# Altium schematic symbol library IC.SchLib: 555 symbols (part 11 of 15)
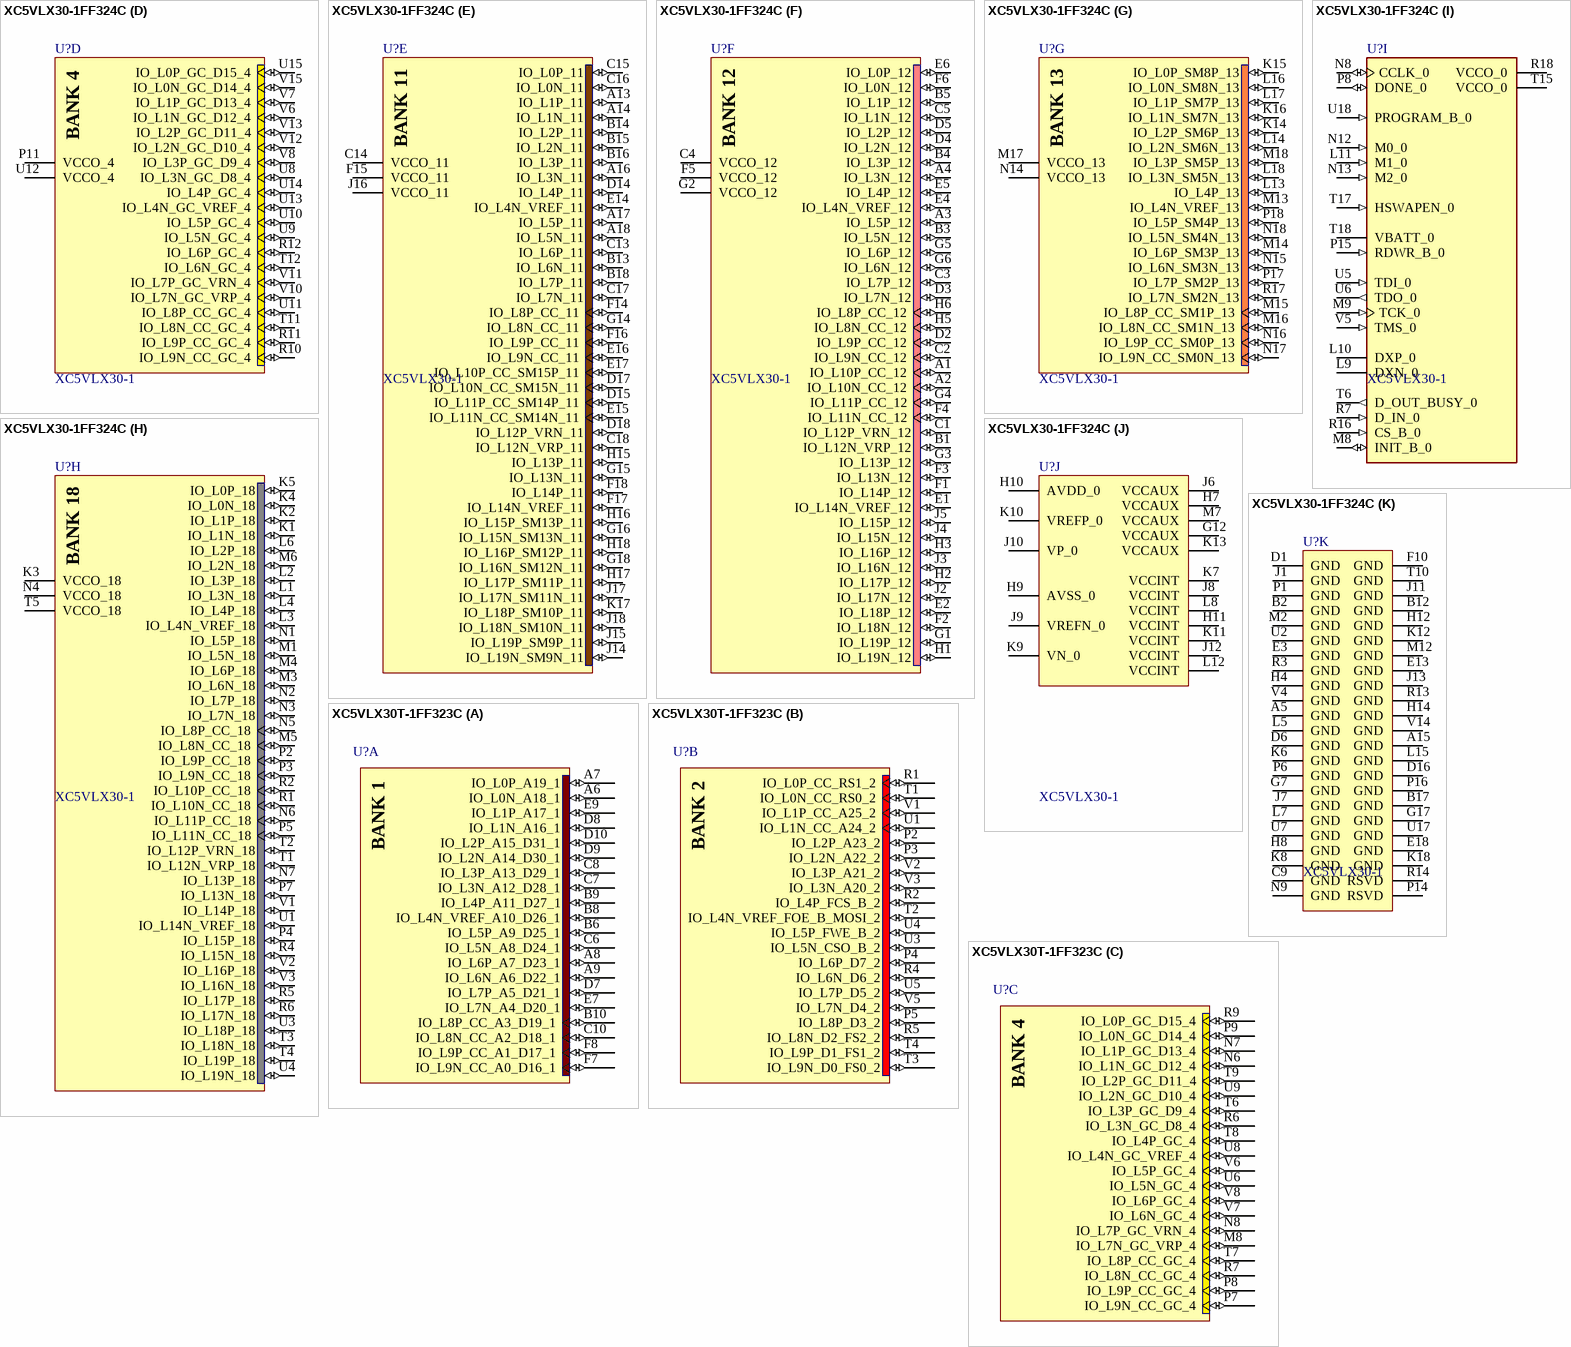
[diagram p80: symbols XC5VLX30-1FF324C to XC5VLX30T-1FF323C]

## XC5VLX30-1FF324C
designator U?, comment XC5VLX30-1
Xilinx Virtex-5 LX Platform FPGA, 324-Ball FFBGA, Speed Grade 1, 220 User I/Os, Commercial Grade; Manufacturer No: XC5VLX30-1FFG324C; Sort: 510; Tech: SMDR; Price: 0; Package: BGA324; Manufacturer: Xilinx
footprint FF324 (BGA, 324-Leads, Body 19x19mm, Pitch 1mm)
3D model XC5VLX30-FF324 (324-Ball Flip Chip Ball Grid Array (FF324))
signal-integrity model XC5VLX30_FF324 (Virtex-5)
part A pins: B7 VCCO_1 (power), C6 IO_L9N_CC_A0_D16_1 (io), C12 IO_L4P_A11_D27_1 (io), D7 IO_L9P_CC_A1_D17_1 (io), D8 IO_L7P_A5_D21_1 (io), D12 IO_L2N_A14_D30_1 (io), D13 IO_L4N_VREF_A10_D26_1 (io), E7 IO_L7N_A4_D20_1 (io), E8 VCCO_1 (power), E12 IO_L2P_A15_D31_1 (io), F7 IO_L5N_A8_D24_1 (io), F8 IO_L3P_A13_D29_1 (io), F9 IO_L1N_A16_1 (io), F11 IO_L0P_A19_1 (io), F12 IO_L6P_A7_D23_1 (io), F13 IO_L6N_A6_D22_1 (io), G8 IO_L5P_A9_D25_1 (io), G9 IO_L3N_A12_D28_1 (io), G10 IO_L1P_A17_1 (io), G11 IO_L0N_A18_1 (io), G13 IO_L8P_CC_A3_D19_1 (io), H13 IO_L8N_CC_A2_D18_1 (io)
part B pins: M10 IO_L6N_D6_2 (io), M11 IO_L8N_D2_FS2_2 (io), N10 IO_L6P_D7_2 (io), N11 IO_L8P_D3_2 (io), P9 IO_L4N_VREF_FOE_B_MOSI_2 (io), P10 IO_L4P_FCS_B_2 (io), P12 IO_L9N_D0_FS0_2 (io), P13 IO_L9P_D1_FS1_2 (io), R8 VCCO_2 (power), R9 IO_L2P_A23_2 (io), R15 IO_L1P_CC_A25_2 (io), T7 IO_L0N_CC_RS0_2 (io), T8 IO_L0P_CC_RS1_2 (io), T9 IO_L2N_A22_2 (io), T13 IO_L7N_D4_2 (io), T14 IO_L7P_D5_2 (io), T16 IO_L1N_CC_A24_2 (io), U16 IO_L5P_FWE_B_2 (io), V9 VCCO_2 (power), V16 IO_L5N_CSO_B_2 (io), V17 IO_L3N_A20_2 (io), V18 IO_L3P_A21_2 (io)
part C pins: A6 IO_L6P_GC_3 (io), A7 IO_L6N_GC_3 (io), A8 IO_L0P_CC_GC_3 (io), A9 IO_L0N_CC_GC_3 (io), A10 VCCO_3 (power), A11 IO_L9P_GC_3 (io), A12 IO_L9N_GC_3 (io), B6 IO_L8P_GC_3 (io), B8 IO_L4N_GC_VREF_3 (io), B9 IO_L1P_CC_GC_3 (io), B10 IO_L1N_CC_GC_3 (io), B11 IO_L7P_GC_3 (io), C7 IO_L8N_GC_3 (io), C8 IO_L4P_GC_3 (io), C10 IO_L5N_GC_3 (io), C11 IO_L7N_GC_3 (io), D9 IO_L2N_GC_VRP_3 (io), D10 IO_L5P_GC_3 (io), D11 VCCO_3 (power), E9 IO_L2P_GC_VRN_3 (io), E10 IO_L3P_GC_3 (io), E11 IO_L3N_GC_3 (io)
part D pins: P11 VCCO_4 (power), R10 IO_L9N_CC_GC_4 (io), R11 IO_L9P_CC_GC_4 (io), R12 IO_L6P_GC_4 (io), T11 IO_L8N_CC_GC_4 (io), T12 IO_L6N_GC_4 (io), U8 IO_L3N_GC_D8_4 (io), U9 IO_L5N_GC_4 (io), U10 IO_L5P_GC_4 (io), U11 IO_L8P_CC_GC_4 (io), U12 VCCO_4 (power), U13 IO_L4N_GC_VREF_4 (io), U14 IO_L4P_GC_4 (io), U15 IO_L0P_GC_D15_4 (io), V6 IO_L1N_GC_D12_4 (io), V7 IO_L1P_GC_D13_4 (io), V8 IO_L3P_GC_D9_4 (io), V10 IO_L7N_GC_VRP_4 (io), V11 IO_L7P_GC_VRN_4 (io), V12 IO_L2N_GC_D10_4 (io), V13 IO_L2P_GC_D11_4 (io), V15 IO_L0N_GC_D14_4 (io)
part E pins: A13 IO_L1P_11 (io), A14 IO_L1N_11 (io), A16 IO_L3N_11 (io), A17 IO_L5P_11 (io), A18 IO_L5N_11 (io), B13 IO_L6N_11 (io), B14 IO_L2P_11 (io), B15 IO_L2N_11 (io), B16 IO_L3P_11 (io), B18 IO_L7P_11 (io), C13 IO_L6P_11 (io), C14 VCCO_11 (power), C15 IO_L0P_11 (io), C16 IO_L0N_11 (io), C17 IO_L7N_11 (io), C18 IO_L12N_VRP_11 (io), D14 IO_L4P_11 (io), D15 IO_L11P_CC_SM14P_11 (io), D17 IO_L10N_CC_SM15N_11 (io), D18 IO_L12P_VRN_11 (io), E14 IO_L4N_VREF_11 (io), E15 IO_L11N_CC_SM14N_11 (io), E16 IO_L9N_CC_11 (io), E17 IO_L10P_CC_SM15P_11 (io), F14 IO_L8P_CC_11 (io), F15 VCCO_11 (power), F16 IO_L9P_CC_11 (io), F17 IO_L14N_VREF_11 (io), F18 IO_L14P_11 (io), G14 IO_L8N_CC_11 (io), G15 IO_L13N_11 (io), G16 IO_L15N_SM13N_11 (io), G18 IO_L16N_SM12N_11 (io), H15 IO_L13P_11 (io), H16 IO_L15P_SM13P_11 (io), H17 IO_L17P_SM11P_11 (io), H18 IO_L16P_SM12P_11 (io), J14 IO_L19N_SM9N_11 (io), J15 IO_L19P_SM9P_11 (io), J16 VCCO_11 (power), J17 IO_L17N_SM11N_11 (io), J18 IO_L18N_SM10N_11 (io), K17 IO_L18P_SM10P_11 (io)
part F pins: A1 IO_L10P_CC_12 (io), A2 IO_L10N_CC_12 (io), A3 IO_L5P_12 (io), A4 IO_L3N_12 (io), B1 IO_L12N_VRP_12 (io), B3 IO_L5N_12 (io), B4 IO_L3P_12 (io), B5 IO_L1P_12 (io), C1 IO_L12P_VRN_12 (io), C2 IO_L9N_CC_12 (io), C3 IO_L7P_12 (io), C4 VCCO_12 (power), C5 IO_L1N_12 (io), D2 IO_L9P_CC_12 (io), D3 IO_L7N_12 (io), D4 IO_L2N_12 (io), D5 IO_L2P_12 (io), E1 IO_L14N_VREF_12 (io), E2 IO_L18P_12 (io), E4 IO_L4N_VREF_12 (io), E5 IO_L4P_12 (io), E6 IO_L0P_12 (io), F1 IO_L14P_12 (io), F2 IO_L18N_12 (io), F3 IO_L13N_12 (io), F4 IO_L11N_CC_12 (io), F5 VCCO_12 (power), F6 IO_L0N_12 (io), G1 IO_L19P_12 (io), G2 VCCO_12 (power), G3 IO_L13P_12 (io), G4 IO_L11P_CC_12 (io), G5 IO_L6P_12 (io), G6 IO_L6N_12 (io), H1 IO_L19N_12 (io), H2 IO_L17P_12 (io), H3 IO_L16P_12 (io), H5 IO_L8N_CC_12 (io), H6 IO_L8P_CC_12 (io), J2 IO_L17N_12 (io), J3 IO_L16N_12 (io), J4 IO_L15N_12 (io), J5 IO_L15P_12 (io)
part G pins: K14 IO_L2P_SM6P_13 (io), K15 IO_L0P_SM8P_13 (io), K16 IO_L1N_SM7N_13 (io), L13 IO_L4P_13 (io), L14 IO_L2N_SM6N_13 (io), L16 IO_L0N_SM8N_13 (io), L17 IO_L1P_SM7P_13 (io), L18 IO_L3N_SM5N_13 (io), M13 IO_L4N_VREF_13 (io), M14 IO_L6P_SM3P_13 (io), M15 IO_L8P_CC_SM1P_13 (io), M16 IO_L8N_CC_SM1N_13 (io), M17 VCCO_13 (power), M18 IO_L3P_SM5P_13 (io), N14 VCCO_13 (power), N15 IO_L6N_SM3N_13 (io), N16 IO_L9P_CC_SM0P_13 (io), N17 IO_L9N_CC_SM0N_13 (io), N18 IO_L5N_SM4N_13 (io), P17 IO_L7P_SM2P_13 (io), P18 IO_L5P_SM4P_13 (io), R17 IO_L7N_SM2N_13 (io)
part H pins: K1 IO_L1N_18 (io), K2 IO_L1P_18 (io), K3 VCCO_18 (power), K4 IO_L0N_18 (io), K5 IO_L0P_18 (io), L1 IO_L3N_18 (io), L2 IO_L3P_18 (io), L3 IO_L4N_VREF_18 (io), L4 IO_L4P_18 (io), L6 IO_L2P_18 (io), M1 IO_L5N_18 (io), M3 IO_L6N_18 (io), M4 IO_L6P_18 (io), M5 IO_L8N_CC_18 (io), M6 IO_L2N_18 (io), N1 IO_L5P_18 (io), N2 IO_L7P_18 (io), N3 IO_L7N_18 (io), N4 VCCO_18 (power), N5 IO_L8P_CC_18 (io), N6 IO_L11P_CC_18 (io), N7 IO_L13P_18 (io), P2 IO_L9P_CC_18 (io), P3 IO_L9N_CC_18 (io), P4 IO_L15P_18 (io), P5 IO_L11N_CC_18 (io), P7 IO_L13N_18 (io), R1 IO_L10N_CC_18 (io), R2 IO_L10P_CC_18 (io), R4 IO_L15N_18 (io), R5 IO_L17P_18 (io), R6 IO_L17N_18 (io), T1 IO_L12N_VRP_18 (io), T2 IO_L12P_VRN_18 (io), T3 IO_L18N_18 (io), T4 IO_L19P_18 (io), T5 VCCO_18 (power), U1 IO_L14N_VREF_18 (io), U3 IO_L18P_18 (io), U4 IO_L19N_18 (io), V1 IO_L14P_18 (io), V2 IO_L16P_18 (io), V3 IO_L16N_18 (io)
part I pins: L9 DXN_0, L10 DXP_0, L11 M1_0 (in), M8 INIT_B_0 (io), M9 TCK_0 (in), N8 CCLK_0 (io), N12 M0_0 (in), N13 M2_0 (in), P8 DONE_0 (io), P15 RDWR_B_0 (in), R7 D_IN_0 (in), R16 CS_B_0 (in), R18 VCCO_0 (power), T6 D_OUT_BUSY_0 (out), T15 VCCO_0 (power), T17 HSWAPEN_0 (in), T18 VBATT_0 (power), U5 TDI_0 (in), U6 TDO_0 (out), U18 PROGRAM_B_0 (in), V5 TMS_0 (in)
part J pins: G12 VCCAUX (power), H7 VCCAUX (power), H9 AVSS_0, H10 AVDD_0, H11 VCCINT (power), J6 VCCAUX (power), J8 VCCINT (power), J9 VREFN_0, J10 VP_0, J12 VCCINT (power), K7 VCCINT (power), K9 VN_0, K10 VREFP_0, K11 VCCINT (power), K13 VCCAUX (power), L8 VCCINT (power), L12 VCCINT (power), M7 VCCAUX (power)
part K pins: A5 GND (power), A15 GND (power), B2 GND (power), B12 GND (power), B17 GND (power), C9 GND (power), D1 GND (power), D6 GND (power), D16 GND (power), E3 GND (power), E13 GND (power), E18 GND (power), F10 GND (power), G7 GND (power), G17 GND (power), H4 GND (power), H8 GND (power), H12 GND (power), H14 GND (power), J1 GND (power), J7 GND (power), J11 GND (power), J13 GND (power), K6 GND (power), K8 GND (power), K12 GND (power), K18 GND (power), L5 GND (power), L7 GND (power), L15 GND (power), M2 GND (power), M12 GND (power), N9 GND (power), P1 GND (power), P6 GND (power), P14 RSVD, P16 GND (power), R3 GND (power), R13 GND (power), R14 RSVD, T10 GND (power), U2 GND (power), U7 GND (power), U17 GND (power), V4 GND (power), V14 GND (power)
part A text: BANK 1
part B text: BANK 2
part C text: BANK 3
part D text: BANK 4
part E text: BANK 11
part F text: BANK 12
part G text: BANK 13
part H text: BANK 18

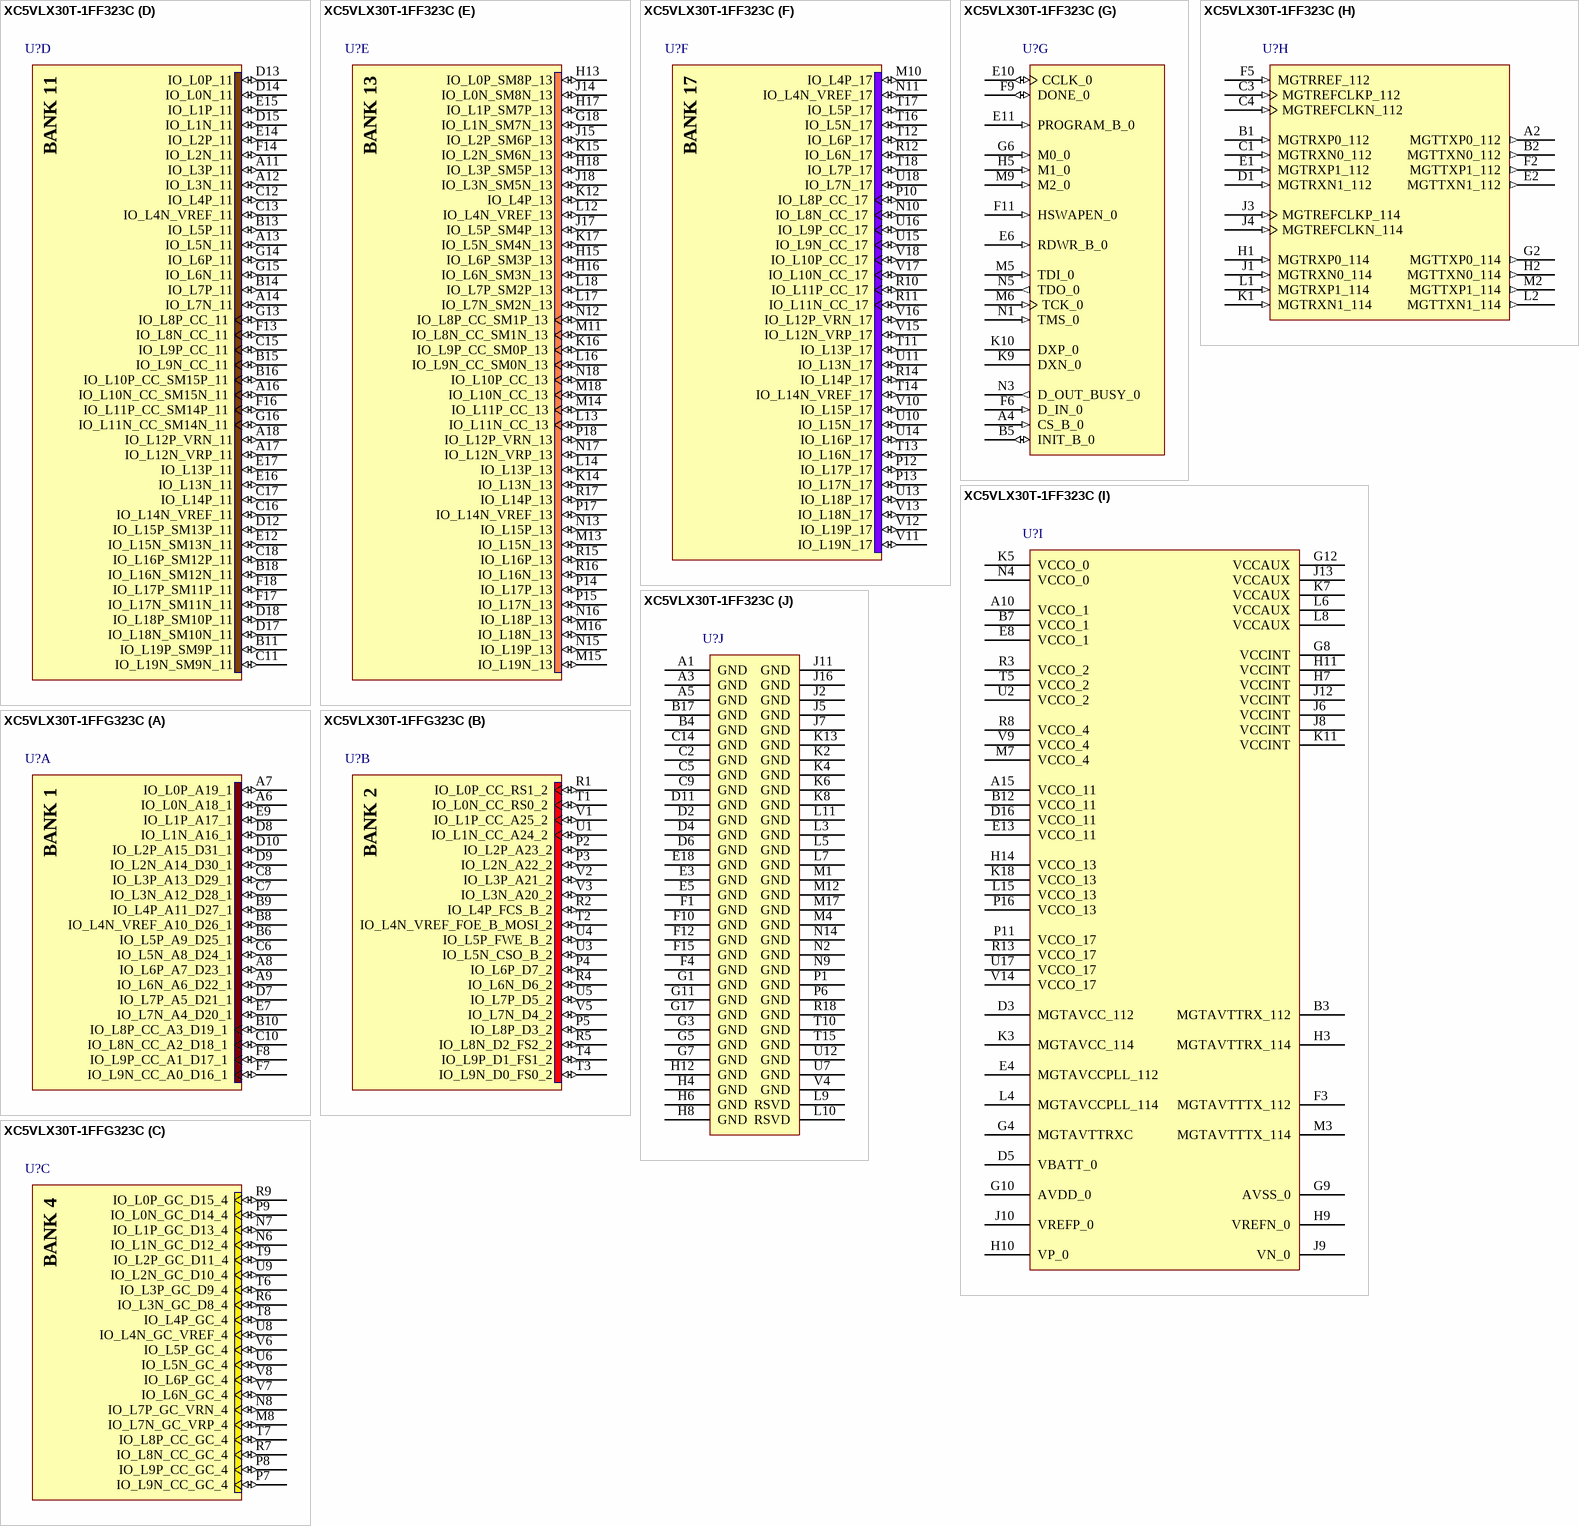
[diagram p47: symbols XC5VLX30T-1FF323C to XC5VLX30T-1FFG323C]

## XC5VLX30T-1FF323C
designator U?
Virtex-5 LXT Platform FPGA, 172 User I/Os, 323-Ball FFBGA, Speed Grade 1, Commercial Grade; FirstPublished: 30-Apr-2009; DatasheetVersion: v5.0, Feb-2009; PackageVersion: ver1.1, Mar-2008; PackageReference: FF323; Publisher: Altium Limited; PackageDescription: 324-Ball Flip Chip Ball Grid Array (FF323); Code_JEDEC: MS-034-AAG-1; Code_IPC: BGA100P18X18-324; ComponentLink1Description: Virtex-5 Datasheet; ComponentLink1URL: http://www.xilinx.com/support/documentation/data_sheets/ds100.pdf; ComponentLink2Description: Pinout Specification; ComponentLink2URL: http://www.xilinx.com/support/documentation/user_guides/ug195.pdf; ComponentLink3Description: FF323 Package Drawing; ComponentLink3URL: http://www.xilinx.com/support/documentation/package_specs/ff323.pdf; ComponentLink4Description: Virtex-5 Documents; ComponentLink4URL: http://www.xilinx.com/support/documentation/virtex-5.htm; ComponentLink5Description: Xilinx.com Home; ComponentLink5URL: http://www.xilinx.com
footprint FF323 (BGA, 324-Leads, Body 19x19mm, Pitch 1mm)
part A pins: A6 IO_L0N_A18_1 (io), A7 IO_L0P_A19_1 (io), A8 IO_L6P_A7_D23_1 (io), A9 IO_L6N_A6_D22_1 (io), B6 IO_L5P_A9_D25_1 (io), B8 IO_L4N_VREF_A10_D26_1 (io), B9 IO_L4P_A11_D27_1 (io), B10 IO_L8P_CC_A3_D19_1 (io), C6 IO_L5N_A8_D24_1 (io), C7 IO_L3N_A12_D28_1 (io), C8 IO_L3P_A13_D29_1 (io), C10 IO_L8N_CC_A2_D18_1 (io), D7 IO_L7P_A5_D21_1 (io), D8 IO_L1N_A16_1 (io), D9 IO_L2N_A14_D30_1 (io), D10 IO_L2P_A15_D31_1 (io), E7 IO_L7N_A4_D20_1 (io), E9 IO_L1P_A17_1 (io), F7 IO_L9N_CC_A0_D16_1 (io), F8 IO_L9P_CC_A1_D17_1 (io)
part B pins: P2 IO_L2P_A23_2 (io), P3 IO_L2N_A22_2 (io), P4 IO_L6P_D7_2 (io), P5 IO_L8P_D3_2 (io), R1 IO_L0P_CC_RS1_2 (io), R2 IO_L4P_FCS_B_2 (io), R4 IO_L6N_D6_2 (io), R5 IO_L8N_D2_FS2_2 (io), T1 IO_L0N_CC_RS0_2 (io), T2 IO_L4N_VREF_FOE_B_MOSI_2 (io), T3 IO_L9N_D0_FS0_2 (io), T4 IO_L9P_D1_FS1_2 (io), U1 IO_L1N_CC_A24_2 (io), U3 IO_L5N_CSO_B_2 (io), U4 IO_L5P_FWE_B_2 (io), U5 IO_L7P_D5_2 (io), V1 IO_L1P_CC_A25_2 (io), V2 IO_L3P_A21_2 (io), V3 IO_L3N_A20_2 (io), V5 IO_L7N_D4_2 (io)
part C pins: M8 IO_L7N_GC_VRP_4 (io), N6 IO_L1N_GC_D12_4 (io), N7 IO_L1P_GC_D13_4 (io), N8 IO_L7P_GC_VRN_4 (io), P7 IO_L9N_CC_GC_4 (io), P8 IO_L9P_CC_GC_4 (io), P9 IO_L0N_GC_D14_4 (io), R6 IO_L3N_GC_D8_4 (io), R7 IO_L8N_CC_GC_4 (io), R9 IO_L0P_GC_D15_4 (io), T6 IO_L3P_GC_D9_4 (io), T7 IO_L8P_CC_GC_4 (io), T8 IO_L4P_GC_4 (io), T9 IO_L2P_GC_D11_4 (io), U6 IO_L5N_GC_4 (io), U8 IO_L4N_GC_VREF_4 (io), U9 IO_L2N_GC_D10_4 (io), V6 IO_L5P_GC_4 (io), V7 IO_L6N_GC_4 (io), V8 IO_L6P_GC_4 (io)
part D pins: A11 IO_L3P_11 (io), A12 IO_L3N_11 (io), A13 IO_L5N_11 (io), A14 IO_L7N_11 (io), A16 IO_L10N_CC_SM15N_11 (io), A17 IO_L12N_VRP_11 (io), A18 IO_L12P_VRN_11 (io), B11 IO_L19P_SM9P_11 (io), B13 IO_L5P_11 (io), B14 IO_L7P_11 (io), B15 IO_L9N_CC_11 (io), B16 IO_L10P_CC_SM15P_11 (io), B18 IO_L16N_SM12N_11 (io), C11 IO_L19N_SM9N_11 (io), C12 IO_L4P_11 (io), C13 IO_L4N_VREF_11 (io), C15 IO_L9P_CC_11 (io), C16 IO_L14N_VREF_11 (io), C17 IO_L14P_11 (io), C18 IO_L16P_SM12P_11 (io), D12 IO_L15P_SM13P_11 (io), D13 IO_L0P_11 (io), D14 IO_L0N_11 (io), D15 IO_L1N_11 (io), D17 IO_L18N_SM10N_11 (io), D18 IO_L18P_SM10P_11 (io), E12 IO_L15N_SM13N_11 (io), E14 IO_L2P_11 (io), E15 IO_L1P_11 (io), E16 IO_L13N_11 (io), E17 IO_L13P_11 (io), F13 IO_L8N_CC_11 (io), F14 IO_L2N_11 (io), F16 IO_L11P_CC_SM14P_11 (io), F17 IO_L17N_SM11N_11 (io), F18 IO_L17P_SM11P_11 (io), G13 IO_L8P_CC_11 (io), G14 IO_L6P_11 (io), G15 IO_L6N_11 (io), G16 IO_L11N_CC_SM14N_11 (io)
part E pins: G18 IO_L1N_SM7N_13 (io), H13 IO_L0P_SM8P_13 (io), H15 IO_L6P_SM3P_13 (io), H16 IO_L6N_SM3N_13 (io), H17 IO_L1P_SM7P_13 (io), H18 IO_L3P_SM5P_13 (io), J14 IO_L0N_SM8N_13 (io), J15 IO_L2P_SM6P_13 (io), J17 IO_L5P_SM4P_13 (io), J18 IO_L3N_SM5N_13 (io), K12 IO_L4P_13 (io), K14 IO_L13N_13 (io), K15 IO_L2N_SM6N_13 (io), K16 IO_L9P_CC_SM0P_13 (io), K17 IO_L5N_SM4N_13 (io), L12 IO_L4N_VREF_13 (io), L13 IO_L11N_CC_13 (io), L14 IO_L13P_13 (io), L16 IO_L9N_CC_SM0N_13 (io), L17 IO_L7N_SM2N_13 (io), L18 IO_L7P_SM2P_13 (io), M11 IO_L8N_CC_SM1N_13 (io), M13 IO_L15N_13 (io), M14 IO_L11P_CC_13 (io), M15 IO_L19N_13 (io), M16 IO_L18N_13 (io), M18 IO_L10N_CC_13 (io), N12 IO_L8P_CC_SM1P_13 (io), N13 IO_L15P_13 (io), N15 IO_L19P_13 (io), N16 IO_L18P_13 (io), N17 IO_L12N_VRP_13 (io), N18 IO_L10P_CC_13 (io), P14 IO_L17P_13 (io), P15 IO_L17N_13 (io), P17 IO_L14N_VREF_13 (io), P18 IO_L12P_VRN_13 (io), R15 IO_L16P_13 (io), R16 IO_L16N_13 (io), R17 IO_L14P_13 (io)
part F pins: M10 IO_L4P_17 (io), N10 IO_L8N_CC_17 (io), N11 IO_L4N_VREF_17 (io), P10 IO_L8P_CC_17 (io), P12 IO_L17P_17 (io), P13 IO_L17N_17 (io), R10 IO_L11P_CC_17 (io), R11 IO_L11N_CC_17 (io), R12 IO_L6N_17 (io), R14 IO_L14P_17 (io), T11 IO_L13P_17 (io), T12 IO_L6P_17 (io), T13 IO_L16N_17 (io), T14 IO_L14N_VREF_17 (io), T16 IO_L5N_17 (io), T17 IO_L5P_17 (io), T18 IO_L7P_17 (io), U10 IO_L15N_17 (io), U11 IO_L13N_17 (io), U13 IO_L18P_17 (io), U14 IO_L16P_17 (io), U15 IO_L9N_CC_17 (io), U16 IO_L9P_CC_17 (io), U18 IO_L7N_17 (io), V10 IO_L15P_17 (io), V11 IO_L19N_17 (io), V12 IO_L19P_17 (io), V13 IO_L18N_17 (io), V15 IO_L12N_VRP_17 (io), V16 IO_L12P_VRN_17 (io), V17 IO_L10N_CC_17 (io), V18 IO_L10P_CC_17 (io)
part G pins: A4 CS_B_0 (in), B5 INIT_B_0 (io), E6 RDWR_B_0 (in), E10 CCLK_0 (io), E11 PROGRAM_B_0 (in), F6 D_IN_0 (in), F9 DONE_0 (io), F11 HSWAPEN_0 (in), G6 M0_0 (in), H5 M1_0 (in), K9 DXN_0, K10 DXP_0, M5 TDI_0 (in), M6 TCK_0 (in), M9 M2_0 (in), N1 TMS_0 (in), N3 D_OUT_BUSY_0 (out), N5 TDO_0 (out)
part H pins: A2 MGTTXP0_112 (out), B1 MGTRXP0_112 (in), B2 MGTTXN0_112 (out), C1 MGTRXN0_112 (in), C3 MGTREFCLKP_112 (in), C4 MGTREFCLKN_112 (in), D1 MGTRXN1_112 (in), E1 MGTRXP1_112 (in), E2 MGTTXN1_112 (out), F2 MGTTXP1_112 (out), F5 MGTRREF_112 (in), G2 MGTTXP0_114 (out), H1 MGTRXP0_114 (in), H2 MGTTXN0_114 (out), J1 MGTRXN0_114 (in), J3 MGTREFCLKP_114 (in), J4 MGTREFCLKN_114 (in), K1 MGTRXN1_114 (in), L1 MGTRXP1_114 (in), L2 MGTTXN1_114 (out), M2 MGTTXP1_114 (out)
part I pins: A10 VCCO_1 (power), A15 VCCO_11 (power), B3 MGTAVTTRX_112 (power), B7 VCCO_1 (power), B12 VCCO_11 (power), D3 MGTAVCC_112 (power), D5 VBATT_0 (power), D16 VCCO_11 (power), E4 MGTAVCCPLL_112 (power), E8 VCCO_1 (power), E13 VCCO_11 (power), F3 MGTAVTTTX_112 (power), G4 MGTAVTTRXC (power), G8 VCCINT (power), G9 AVSS_0 (power), G10 AVDD_0 (power), G12 VCCAUX (power), H3 MGTAVTTRX_114 (power), H7 VCCINT (power), H9 VREFN_0 (power), H10 VP_0 (power), H11 VCCINT (power), H14 VCCO_13 (power), J6 VCCINT (power), J8 VCCINT (power), J9 VN_0 (power), J10 VREFP_0 (power), J12 VCCINT (power), J13 VCCAUX (power), K3 MGTAVCC_114 (power), K5 VCCO_0 (power), K7 VCCAUX (power), K11 VCCINT (power), K18 VCCO_13 (power), L4 MGTAVCCPLL_114 (power), L6 VCCAUX (power), L8 VCCAUX (power), L15 VCCO_13 (power), M3 MGTAVTTTX_114 (power), M7 VCCO_4 (power), N4 VCCO_0 (power), P11 VCCO_17 (power), P16 VCCO_13 (power), R3 VCCO_2 (power), R8 VCCO_4 (power), R13 VCCO_17 (power), T5 VCCO_2 (power), U2 VCCO_2 (power), U17 VCCO_17 (power), V9 VCCO_4 (power), V14 VCCO_17 (power)
part J pins: A1 GND (power), A3 GND (power), A5 GND (power), B4 GND (power), B17 GND (power), C2 GND (power), C5 GND (power), C9 GND (power), C14 GND (power), D2 GND (power), D4 GND (power), D6 GND (power), D11 GND (power), E3 GND (power), E5 GND (power), E18 GND (power), F1 GND (power), F4 GND (power), F10 GND (power), F12 GND (power), F15 GND (power), G1 GND (power), G3 GND (power), G5 GND (power), G7 GND (power), G11 GND (power), G17 GND (power), H4 GND (power), H6 GND (power), H8 GND (power), H12 GND (power), J2 GND (power), J5 GND (power), J7 GND (power), J11 GND (power), J16 GND (power), K2 GND (power), K4 GND (power), K6 GND (power), K8 GND (power), K13 GND (power), L3 GND (power), L5 GND (power), L7 GND (power), L9 RSVD, L10 RSVD, L11 GND (power), M1 GND (power), M4 GND (power), M12 GND (power), M17 GND (power), N2 GND (power), N9 GND (power), N14 GND (power), P1 GND (power), P6 GND (power), R18 GND (power), T10 GND (power), T15 GND (power), U7 GND (power), U12 GND (power), V4 GND (power)
part A text: BANK 1
part B text: BANK 2
part C text: BANK 4
part D text: BANK 11
part E text: BANK 13
part F text: BANK 17

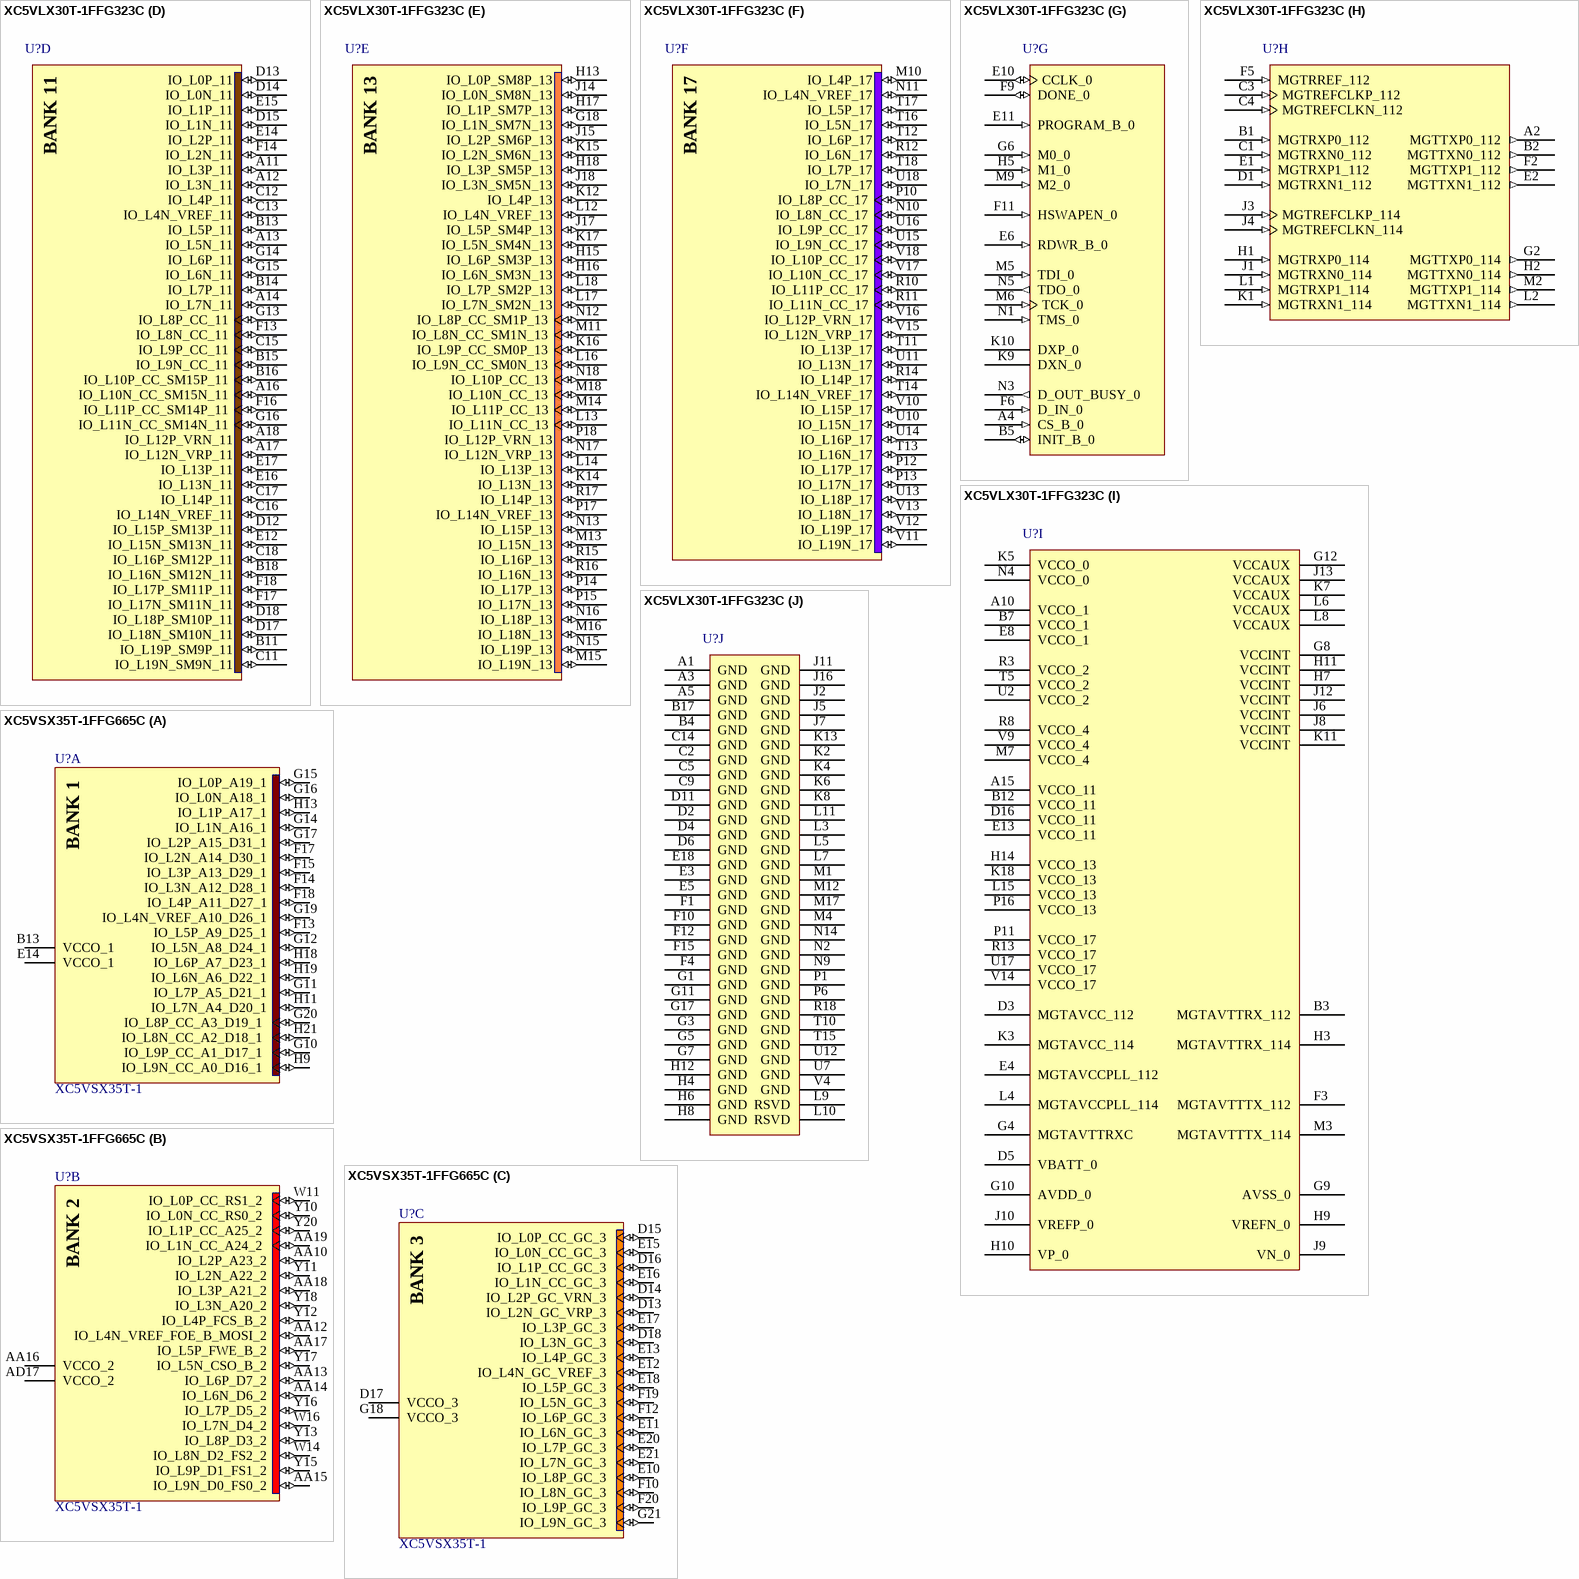
[diagram p48: symbols XC5VLX30T-1FFG323C to XC5VSX35T-1FFG665C]

## XC5VLX30T-1FFG323C
designator U?
Virtex-5 LXT Platform FPGA, 172 User I/Os, 323-Ball FFBGA, Speed Grade 1, Commercial Grade, Pb-Free; FirstPublished: 30-Apr-2009; DatasheetVersion: v5.0, Feb-2009; PackageVersion: ver1.1, Mar-2008; PackageReference: FFG323; Publisher: Altium Limited; PackageDescription: 324-Ball Flip Chip Ball Grid Array (FFG323) - Pb-Free; Supplier 1: Digi-Key; Supplier Part Number 1: XC5VLX30T-1FFG323C-ND; Code_JEDEC: MS-034-AAG-1; Code_IPC: BGA100P18X18-324; ComponentLink1Description: Virtex-5 Datasheet; ComponentLink1URL: http://www.xilinx.com/support/documentation/data_sheets/ds100.pdf; ComponentLink2Description: Pinout Specification; ComponentLink2URL: http://www.xilinx.com/support/documentation/user_guides/ug195.pdf; ComponentLink3Description: FFG323 Package Drawing; ComponentLink3URL: http://www.xilinx.com/support/documentation/package_specs/ff323.pdf; ComponentLink4Description: Virtex-5 Documents; ComponentLink4URL: http://www.xilinx.com/support/documentation/virtex-5.htm; ComponentLink5Description: Xilinx.com Home; ComponentLink5URL: http://www.xilinx.com
footprint FFG323 (BGA, 324-Leads, Body 19x19mm, Pitch 1mm)
part A pins: A6 IO_L0N_A18_1 (io), A7 IO_L0P_A19_1 (io), A8 IO_L6P_A7_D23_1 (io), A9 IO_L6N_A6_D22_1 (io), B6 IO_L5P_A9_D25_1 (io), B8 IO_L4N_VREF_A10_D26_1 (io), B9 IO_L4P_A11_D27_1 (io), B10 IO_L8P_CC_A3_D19_1 (io), C6 IO_L5N_A8_D24_1 (io), C7 IO_L3N_A12_D28_1 (io), C8 IO_L3P_A13_D29_1 (io), C10 IO_L8N_CC_A2_D18_1 (io), D7 IO_L7P_A5_D21_1 (io), D8 IO_L1N_A16_1 (io), D9 IO_L2N_A14_D30_1 (io), D10 IO_L2P_A15_D31_1 (io), E7 IO_L7N_A4_D20_1 (io), E9 IO_L1P_A17_1 (io), F7 IO_L9N_CC_A0_D16_1 (io), F8 IO_L9P_CC_A1_D17_1 (io)
part B pins: P2 IO_L2P_A23_2 (io), P3 IO_L2N_A22_2 (io), P4 IO_L6P_D7_2 (io), P5 IO_L8P_D3_2 (io), R1 IO_L0P_CC_RS1_2 (io), R2 IO_L4P_FCS_B_2 (io), R4 IO_L6N_D6_2 (io), R5 IO_L8N_D2_FS2_2 (io), T1 IO_L0N_CC_RS0_2 (io), T2 IO_L4N_VREF_FOE_B_MOSI_2 (io), T3 IO_L9N_D0_FS0_2 (io), T4 IO_L9P_D1_FS1_2 (io), U1 IO_L1N_CC_A24_2 (io), U3 IO_L5N_CSO_B_2 (io), U4 IO_L5P_FWE_B_2 (io), U5 IO_L7P_D5_2 (io), V1 IO_L1P_CC_A25_2 (io), V2 IO_L3P_A21_2 (io), V3 IO_L3N_A20_2 (io), V5 IO_L7N_D4_2 (io)
part C pins: M8 IO_L7N_GC_VRP_4 (io), N6 IO_L1N_GC_D12_4 (io), N7 IO_L1P_GC_D13_4 (io), N8 IO_L7P_GC_VRN_4 (io), P7 IO_L9N_CC_GC_4 (io), P8 IO_L9P_CC_GC_4 (io), P9 IO_L0N_GC_D14_4 (io), R6 IO_L3N_GC_D8_4 (io), R7 IO_L8N_CC_GC_4 (io), R9 IO_L0P_GC_D15_4 (io), T6 IO_L3P_GC_D9_4 (io), T7 IO_L8P_CC_GC_4 (io), T8 IO_L4P_GC_4 (io), T9 IO_L2P_GC_D11_4 (io), U6 IO_L5N_GC_4 (io), U8 IO_L4N_GC_VREF_4 (io), U9 IO_L2N_GC_D10_4 (io), V6 IO_L5P_GC_4 (io), V7 IO_L6N_GC_4 (io), V8 IO_L6P_GC_4 (io)
part D pins: A11 IO_L3P_11 (io), A12 IO_L3N_11 (io), A13 IO_L5N_11 (io), A14 IO_L7N_11 (io), A16 IO_L10N_CC_SM15N_11 (io), A17 IO_L12N_VRP_11 (io), A18 IO_L12P_VRN_11 (io), B11 IO_L19P_SM9P_11 (io), B13 IO_L5P_11 (io), B14 IO_L7P_11 (io), B15 IO_L9N_CC_11 (io), B16 IO_L10P_CC_SM15P_11 (io), B18 IO_L16N_SM12N_11 (io), C11 IO_L19N_SM9N_11 (io), C12 IO_L4P_11 (io), C13 IO_L4N_VREF_11 (io), C15 IO_L9P_CC_11 (io), C16 IO_L14N_VREF_11 (io), C17 IO_L14P_11 (io), C18 IO_L16P_SM12P_11 (io), D12 IO_L15P_SM13P_11 (io), D13 IO_L0P_11 (io), D14 IO_L0N_11 (io), D15 IO_L1N_11 (io), D17 IO_L18N_SM10N_11 (io), D18 IO_L18P_SM10P_11 (io), E12 IO_L15N_SM13N_11 (io), E14 IO_L2P_11 (io), E15 IO_L1P_11 (io), E16 IO_L13N_11 (io), E17 IO_L13P_11 (io), F13 IO_L8N_CC_11 (io), F14 IO_L2N_11 (io), F16 IO_L11P_CC_SM14P_11 (io), F17 IO_L17N_SM11N_11 (io), F18 IO_L17P_SM11P_11 (io), G13 IO_L8P_CC_11 (io), G14 IO_L6P_11 (io), G15 IO_L6N_11 (io), G16 IO_L11N_CC_SM14N_11 (io)
part E pins: G18 IO_L1N_SM7N_13 (io), H13 IO_L0P_SM8P_13 (io), H15 IO_L6P_SM3P_13 (io), H16 IO_L6N_SM3N_13 (io), H17 IO_L1P_SM7P_13 (io), H18 IO_L3P_SM5P_13 (io), J14 IO_L0N_SM8N_13 (io), J15 IO_L2P_SM6P_13 (io), J17 IO_L5P_SM4P_13 (io), J18 IO_L3N_SM5N_13 (io), K12 IO_L4P_13 (io), K14 IO_L13N_13 (io), K15 IO_L2N_SM6N_13 (io), K16 IO_L9P_CC_SM0P_13 (io), K17 IO_L5N_SM4N_13 (io), L12 IO_L4N_VREF_13 (io), L13 IO_L11N_CC_13 (io), L14 IO_L13P_13 (io), L16 IO_L9N_CC_SM0N_13 (io), L17 IO_L7N_SM2N_13 (io), L18 IO_L7P_SM2P_13 (io), M11 IO_L8N_CC_SM1N_13 (io), M13 IO_L15N_13 (io), M14 IO_L11P_CC_13 (io), M15 IO_L19N_13 (io), M16 IO_L18N_13 (io), M18 IO_L10N_CC_13 (io), N12 IO_L8P_CC_SM1P_13 (io), N13 IO_L15P_13 (io), N15 IO_L19P_13 (io), N16 IO_L18P_13 (io), N17 IO_L12N_VRP_13 (io), N18 IO_L10P_CC_13 (io), P14 IO_L17P_13 (io), P15 IO_L17N_13 (io), P17 IO_L14N_VREF_13 (io), P18 IO_L12P_VRN_13 (io), R15 IO_L16P_13 (io), R16 IO_L16N_13 (io), R17 IO_L14P_13 (io)
part F pins: M10 IO_L4P_17 (io), N10 IO_L8N_CC_17 (io), N11 IO_L4N_VREF_17 (io), P10 IO_L8P_CC_17 (io), P12 IO_L17P_17 (io), P13 IO_L17N_17 (io), R10 IO_L11P_CC_17 (io), R11 IO_L11N_CC_17 (io), R12 IO_L6N_17 (io), R14 IO_L14P_17 (io), T11 IO_L13P_17 (io), T12 IO_L6P_17 (io), T13 IO_L16N_17 (io), T14 IO_L14N_VREF_17 (io), T16 IO_L5N_17 (io), T17 IO_L5P_17 (io), T18 IO_L7P_17 (io), U10 IO_L15N_17 (io), U11 IO_L13N_17 (io), U13 IO_L18P_17 (io), U14 IO_L16P_17 (io), U15 IO_L9N_CC_17 (io), U16 IO_L9P_CC_17 (io), U18 IO_L7N_17 (io), V10 IO_L15P_17 (io), V11 IO_L19N_17 (io), V12 IO_L19P_17 (io), V13 IO_L18N_17 (io), V15 IO_L12N_VRP_17 (io), V16 IO_L12P_VRN_17 (io), V17 IO_L10N_CC_17 (io), V18 IO_L10P_CC_17 (io)
part G pins: A4 CS_B_0 (in), B5 INIT_B_0 (io), E6 RDWR_B_0 (in), E10 CCLK_0 (io), E11 PROGRAM_B_0 (in), F6 D_IN_0 (in), F9 DONE_0 (io), F11 HSWAPEN_0 (in), G6 M0_0 (in), H5 M1_0 (in), K9 DXN_0, K10 DXP_0, M5 TDI_0 (in), M6 TCK_0 (in), M9 M2_0 (in), N1 TMS_0 (in), N3 D_OUT_BUSY_0 (out), N5 TDO_0 (out)